# Altium footprint library Toi Library.PcbLib: 740 footprints (part 32 of 47)
Each footprint in its own frame and in the unit in brackets; x right, y up, seen from the top. Pads: shape width x height; smd on the part's side, far side on the other; paste and mask are expansions set on the pad; w line width, h text height; cw(c..) or ccw(c..) is an arc to the next point about the centre after c.
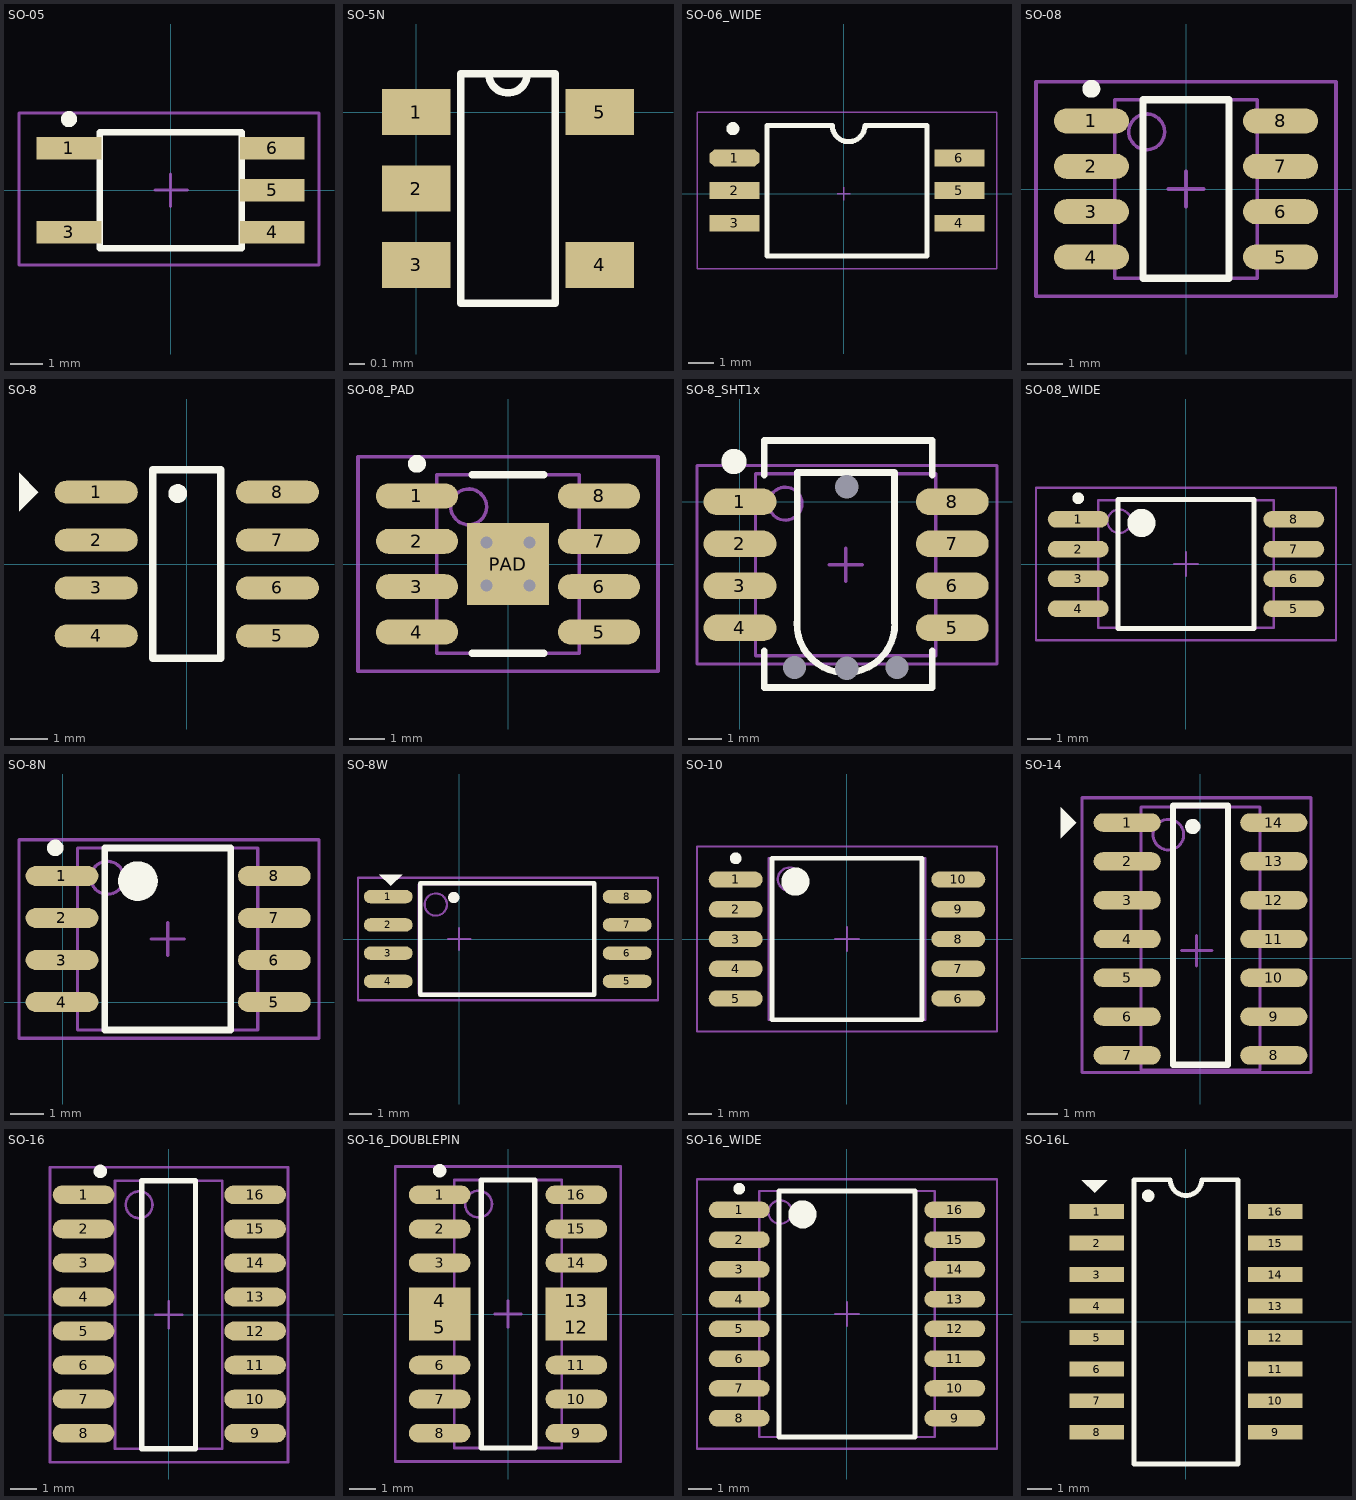
[diagram p31: the footprints below, top view; thin cyan lines are the x and y axes]

## SO-05 [mm] "SOIC, 8-Leads, Body 4.9x3.9mm, Pitch 1.27mm, IPC Low Density"
height 2.59
pads (5):
  rect 2x0.7 smd: 1(-3.15,1.3) 3(-3.15,-1.3) 4(3.15,-1.3) 5(3.15,0) 6(3.15,1.3)
Top Overlay:
  circle w0.25: c-3.15,2.2 r0.125
  lines w0.2: -2.2,-1.8 -2.2,1.8 2.2,1.8 2.2,-1.8 -2.2,-1.8
Mechanical 13:
  lines w0.1: -2.2,-1.8 -2.2,1.8 2.2,1.8 2.2,-1.8 -2.2,-1.8
Mechanical 15:
  lines w0.1: -0.475,0 0.525,0 ; 0,-0.5 0,0.5 ; -4.7,-2.325 -4.7,2.395 4.6,2.395 4.6,-2.325 -4.7,-2.325
3D body: height 2.59, standoff 0, extent -2.2,-1.8 2.2,1.8

## SO-5N [mm]
pads (5):
  rect 0.45x0.3 smd mask+0.05: 1(0,0) 2(0,-0.5) 3(0,-1) 4(1.2,-1) 5(1.2,0)
Top Overlay:
  lines w0.05: 0.29,-1.25 0.91,-1.25 0.91,0.25 0.475,0.25 ccw(c0.6,0.25) 0.725,0.25 0.29,0.25 0.29,-1.25

## SO-06_WIDE [mil]
height 125.2
pads (6):
  oct 76x26 smd: 1(-167.5,55)
  rect 76x26 smd: 2(-167.5,5) 3(-167.5,-45) 4(177.5,-45) 5(177.5,5) 6(177.5,55)
Top Overlay:
  circle w10: c-170,100 r5
  lines w7.87: -117.5,-95 -117.5,105 -17.5,105 ccw(c7.5,105) 32.5,105 127.5,105 127.5,-95 -117.5,-95
Mechanical 15:
  lines w1.97: -10,0 10,0 ; 0,-10 0,10 ; -225,-115 -225,125 235,125 235,-115 -225,-115
3D body: height 125.2, standoff 0, extent -117.52,-95.02 127.52,105.02

## SO-08 [mm] "SOIC, 8-Leads, Body 4.9x3.9mm, Pitch 1.27mm, IPC Low Density"
height 2.59
pads (8):
  oval 2.1x0.7 smd: 1(-2.65,1.905) 2(-2.65,0.635) 3(-2.65,-0.635) 4(-2.65,-1.905) 5(2.65,-1.905) 6(2.65,-0.635) 7(2.65,0.635) 8(2.65,1.905)
Top Overlay:
  circle w0.25: c-2.65,2.805 r0.125
  lines w0.2: -1.2,-2.5 -1.2,2.5 1.2,2.5 1.2,-2.5 -1.2,-2.5
Mechanical 13:
  circle w0.1: c-1.1,1.6 r0.5
  lines w0.1: -2,-2.5 -2,2.5 2,2.5 2,-2.5 -2,-2.5
Mechanical 15:
  lines w0.1: -0.5,0 0.5,0 ; 0,-0.5 0,0.5 ; -4.2,-3 -4.2,3 4.2,3 4.2,-3 -4.2,-3
3D body: height 2.59, standoff 0, extent -2,-2.5 2,2.5

## SO-8 [mm] "8-Pin Small Outline Integrated Circuit 1.27 mm Pitch, IPC Medium Density"
height 1.75
pads (8):
  oval 2.2x0.6 smd: 1(-2.4,1.905) 2(-2.4,0.635) 3(-2.4,-0.635) 4(-2.4,-1.905) 5(2.4,-1.905) 6(2.4,-0.635) 7(2.4,0.635) 8(2.4,1.905)
Top Overlay:
  circle w0.25: c-0.241,1.866 r0.125
  region: -4.445,1.397 -3.937,1.905 -4.445,2.413
  lines w0.2: -0.9,-2.5 -0.9,2.5 0.9,2.5 0.9,-2.5 -0.9,-2.5
3D body "User Library-SOIC-8.STEP": height 1.75, standoff 0, extent -2.93,-2.511 3.082,2.489

## SO-08_PAD [mm] "SOIC, 8-Leads, Body 4.9x3.9mm, Pitch 1.27mm, Exposed Pad, IPC Low Density"
height 1.68
pads (9):
  oval 2.3x0.7 smd: 1(-2.55,1.905) 2(-2.55,0.635) 3(-2.55,-0.635) 4(-2.55,-1.905) 5(2.55,-1.905) 6(2.55,-0.635) 7(2.55,0.635) 8(2.55,1.905)
  rect 2.29x2.29 smd: PAD(0,0)
via -0.6,0.6 diameter 0.66 hole 0.33
via 0.6,0.6 diameter 0.66 hole 0.33
via 0.6,-0.6 diameter 0.66 hole 0.33
via -0.6,-0.6 diameter 0.66 hole 0.33
Top Overlay:
  circle w0.25: c-2.55,2.805 r0.125
  lines w0.2: -1,-2.5 1,-2.5 ; -1,2.5 1,2.5 -1,2.5
Mechanical 13:
  circle w0.1: c-1.1,1.6 r0.5
  lines w0.1: -2,-2.5 2,-2.5 2,2.5 -2,2.5 -2,-2.5
Mechanical 15:
  lines w0.1: -4.2,-3 4.2,-3 4.2,3 -4.2,3 -4.2,-3 ; -0.5,0 0.5,0 -0.5,0 ; 0,-0.5 0,0.5 0,-0.5
3D body: height 1.68, standoff 0.03, extent -2,-2.5 2,2.5

## SO-8_SHT1x [mm] "SOP, 8-Leads, Body 5.3x5.3mm, Pitch 1.27mm, IPC Medium Density"
height 2.03
pads (12):
  round 0 hole 0.7: 0(1.651,-5.004) 0(3.226,-5.029) 0(3.226,0.457) 0(4.75,-5.004)
  oval 2.2x0.8 smd: 1(0,0) 2(0,-1.27) 3(0,-2.54) 4(0,-3.81) 5(6.419,-3.81) 6(6.419,-2.54) 7(6.419,-1.27) 8(6.419,0)
Top Overlay:
  circle w0.6: c-0.183,1.219 r0.081
  lines w0.2: 0.737,-4.5 0.737,-5.613 5.817,-5.613 5.817,-4.5 ; 0.737,0.8 0.737,1.854 5.817,1.854 5.817,0.8
  lines w0.203: 1.72,-3.645 ccw(c3.2,-3.683) 4.681,-3.659 ; 1.727,-3.708 1.727,0.889 4.674,0.889 4.674,-3.658
Mechanical 13:
  circle w0.1: c1.372,-0.055 r0.5
  lines w0.1: 0.472,-4.655 5.922,-4.655 5.922,0.845 0.472,0.845 0.472,-4.655
Mechanical 15:
  lines w0.1: 2.697,-1.905 3.697,-1.905 ; 3.197,-2.405 3.197,-1.405 ; -1.299,-4.905 7.769,-4.905 7.769,1.095 -1.299,1.095 -1.299,-4.905
3D body "User Library-SOIC.STEP": height 1.7, standoff 0, extent 0.098,-4.293 6.296,0.533

## SO-08_WIDE [mm] "SOIC, 8-Leads, Body 5.3x7.5mm, Pitch 1.27mm, IPC Low Density"
height 2.65
pads (8):
  oval 2.6x0.7 smd: 1(-4.6,1.905) 2(-4.6,0.635) 3(-4.6,-0.635) 4(-4.6,-1.905) 5(4.6,-1.905) 6(4.6,-0.635) 7(4.6,0.635) 8(4.6,1.905)
Top Overlay:
  circle w0.25: c-4.6,2.805 r0.125
  circle w0.6: c-1.9,1.75 r0.3
  lines w0.2: -2.9,-2.75 -2.9,2.75 2.9,2.75 2.9,-2.75 -2.9,-2.75
Mechanical 13:
  circle w0.1: c-2.85,1.825 r0.5
  lines w0.1: -3.75,-2.725 -3.75,2.725 3.75,2.725 3.75,-2.725 -3.75,-2.725
Mechanical 15:
  lines w0.1: -0.5,0 0.5,0 ; 0,-0.5 0,0.5 ; -6.4,-3.25 -6.4,3.25 6.4,3.25 6.4,-3.25 -6.4,-3.25
3D body: height 2.65, standoff 0, extent -3.75,-2.725 3.75,2.725

## SO-8N [mm] "SOP, 8-Leads, Body 5.3x5.3mm, Pitch 1.27mm, IPC Medium Density"
height 2.03
pads (8):
  oval 2.2x0.6 smd: 1(-0.022,3.81) 2(-0.022,2.54) 3(-0.022,1.27) 4(-0.022,0) 5(6.397,0) 6(6.397,1.27) 7(6.397,2.54) 8(6.397,3.81)
Top Overlay:
  circle w0.25: c-0.225,4.66 r0.125
  circle w0.6: c2.275,3.655 r0.3
  lines w0.2: 1.275,-0.845 1.275,4.655 5.075,4.655 5.075,-0.845 1.275,-0.845
Mechanical 13:
  circle w0.1: c1.35,3.755 r0.5
  lines w0.1: 0.45,-0.845 0.45,4.655 5.9,4.655 5.9,-0.845 0.45,-0.845
Mechanical 15:
  lines w0.1: 2.675,1.905 3.675,1.905 ; 3.175,1.405 3.175,2.405 ; -1.321,-1.095 -1.321,4.905 7.747,4.905 7.747,-1.095 -1.321,-1.095
3D body "User Library-SOIC.STEP": height 1.7, standoff 0, extent 0.076,-0.483 6.274,4.343

## SO-8W [mm] "8-Pin Small Outline Integrated Circuit 1.27 mm Pitch, IPC Medium Density"
height 1.75
pads (8):
  oval 2.2x0.6 smd: 1(-3.187,1.905) 2(-3.187,0.635) 3(-3.187,-0.635) 4(-3.187,-1.905) 5(7.556,-1.905) 6(7.556,-0.635) 7(7.556,0.635) 8(7.556,1.905)
Top Overlay:
  circle w0.25: c-0.241,1.866 r0.125
  region: -3.581,2.896 -3.073,2.388 -2.565,2.896
  lines w0.2: -1.753,-2.5 6.071,-2.5 6.071,2.5 -1.753,2.5 -1.753,-2.5
Mechanical 13:
  circle w0.1: c-1.05,1.55 r0.5
  lines w0.1: -1.829,-2.45 6.096,-2.45 6.096,2.45 -1.829,2.45 -1.829,-2.45
Mechanical 15:
  lines w0.1: -0.5,0 0.5,0 ; 0,-0.5 0,0.5 ; -4.547,-2.75 8.941,-2.75 8.941,2.75 -4.547,2.75 -4.547,-2.75
3D body "User Library-SOIC (2).STEP": height 1.7, standoff 0, extent -3.124,-2.413 7.518,2.413

## SO-10 [mm] "CERPACK, 10-Leads, Body 6.9x6.3mm, Pitch 1.27mm, IPC Low Density"
height 2.25
pads (10):
  oval 2.3x0.7 smd: 1(-4.75,2.54) 2(-4.75,1.27) 3(-4.75,0) 4(-4.75,-1.27) 5(-4.75,-2.54) 6(4.75,-2.54) 7(4.75,-1.27) 8(4.75,0) 9(4.75,1.27) 10(4.75,2.54)
Top Overlay:
  circle w0.6: c-2.2,2.45 r0.3
  circle w0.25: c-4.75,3.44 r0.125
  lines w0.2: -3.2,-3.45 3.2,-3.45 3.2,3.45 -3.2,3.45 -3.2,-3.45
Mechanical 13:
  circle w0.1: c-2.45,2.55 r0.5
  lines w0.1: -3.35,-3.45 3.35,-3.45 3.35,3.45 -3.35,3.45 -3.35,-3.45
Mechanical 15:
  lines w0.1: -0.5,0 0.5,0 ; 0,-0.5 0,0.5 ; -6.4,-3.95 6.4,-3.95 6.4,3.95 -6.4,3.95 -6.4,-3.95
3D body: height 2.25, standoff 0.1, extent -3.4,-3.5 3.4,3.5

## SO-14 [mm] "SOIC, 14-Leads, Body 9.9x3.9mm, Pitch 1.27mm, IPC Medium Density"
height 1.75
pads (14):
  oval 2.2x0.6 smd: 1(-2.4,4.445) 2(-2.4,3.175) 3(-2.4,1.905) 4(-2.4,0.635) 5(-2.4,-0.635) 6(-2.4,-1.905) 7(-2.4,-3.175) 8(2.4,-3.175) 9(2.4,-1.905) 10(2.4,-0.635) 11(2.4,0.635) 12(2.4,1.905) 13(2.4,3.175) 14(2.4,4.445)
Top Overlay:
  circle w0.25: c-0.252,4.318 r0.125
  region: -4.572,3.937 -4.064,4.445 -4.572,4.953
  lines w0.2: -0.9,-3.48 -0.9,5 0.9,5 0.9,-3.48 -0.9,-3.48
Mechanical 13:
  circle w0.1: c-1.05,4.05 r0.5
  lines w0.1: -1.95,-3.658 -1.95,4.95 1.95,4.95 1.95,-3.658 -1.95,-3.658
Mechanical 15:
  lines w0.1: -0.627,0.254 0.373,0.254 ; -0.127,-0.246 -0.127,0.754 ; -3.877,-3.734 -3.877,5.258 3.623,5.258 3.623,-3.734 -3.877,-3.734
3D body "User Library-SOIC.STEP14N": height 1.7, standoff 0, extent -2.997,-3.708 3.2,4.928

## SO-16 [mm] "SOIC, 16-Leads, Body 9.9x3.9mm, Pitch 1.27mm, IPC Low Density"
height 1.73
pads (16):
  oval 2.3x0.7 smd: 1(-3.175,4.47) 2(-3.175,3.2) 3(-3.175,1.93) 4(-3.175,0.66) 5(-3.175,-0.61) 6(-3.175,-1.88) 7(-3.175,-3.15) 8(-3.175,-4.42) 9(3.225,-4.42) 10(3.225,-3.15) 11(3.225,-1.88) 12(3.225,-0.61) 13(3.225,0.66) 14(3.225,1.93) 15(3.225,3.2) 16(3.225,4.47)
Top Overlay:
  circle w0.25: c-2.55,5.345 r0.125
  lines w0.2: -1,-5 1,-5 1,5 -1,5 -1,-5
Mechanical 13:
  circle w0.1: c-1.1,4.1 r0.5
  lines w0.1: -2,-5 2,-5 2,5 -2,5 -2,-5
Mechanical 15:
  lines w0.1: -0.5,0 0.5,0 ; 0,-0.5 0,0.5 ; -4.425,-5.5 4.45,-5.5 4.45,5.5 -4.425,5.5 -4.425,-5.5
3D body "SOP16_208mil (5_3mm).STEP": height 1.8, standoff -0.2, extent -3.96,-5.075 3.961,5.125

## SO-16_DOUBLEPIN [mm] "16-Pin Small Outline Integrated Circuit 1.27 mm Pitch"
height 1.5
pads (16):
  oval 2.3x0.7 smd: 1(-2.55,4.445) 2(-2.55,3.175) 3(-2.55,1.905) 6(-2.55,-1.905) 7(-2.55,-3.175) 8(-2.55,-4.445) 9(2.55,-4.445) 10(2.55,-3.175) 11(2.55,-1.905) 14(2.55,1.905) 15(2.55,3.175) 16(2.55,4.445)
  rect 2.3x0.99 smd: 4(-2.55,0.49) 5(-2.55,-0.49) 12(2.55,-0.49) 13(2.55,0.49)
Top Overlay:
  circle w0.25: c-2.55,5.345 r0.125
  lines w0.2: -1,-5 -1,5 1,5 1,-5 -1,-5
Mechanical 13:
  circle w0.1: c-1.1,4.1 r0.5
  lines w0.1: -2,-5 -2,5 2,5 2,-5 -2,-5
Mechanical 15:
  lines w0.1: -0.5,0 0.5,0 ; 0,-0.5 0,0.5 ; -4.2,-5.5 -4.2,5.5 4.2,5.5 4.2,-5.5 -4.2,-5.5
3D body: height 1.5, standoff 0, extent -2,-5 2,5

## SO-16_WIDE [mm] "SOIC, 16-Leads, Body 10.3x7.5mm, Pitch 1.27mm, IPC Low Density"
height 2.65
pads (16):
  oval 2.6x0.7 smd: 1(-4.6,4.445) 2(-4.6,3.175) 3(-4.6,1.905) 4(-4.6,0.635) 5(-4.6,-0.635) 6(-4.6,-1.905) 7(-4.6,-3.175) 8(-4.6,-4.445) 9(4.6,-4.445) 10(4.6,-3.175) 11(4.6,-1.905) 12(4.6,-0.635) 13(4.6,0.635) 14(4.6,1.905) 15(4.6,3.175) 16(4.6,4.445)
Top Overlay:
  circle w0.6: c-1.9,4.25 r0.3
  circle w0.25: c-4.6,5.345 r0.125
  lines w0.2: -2.9,-5.25 2.9,-5.25 2.9,5.25 -2.9,5.25 -2.9,-5.25
Mechanical 13:
  circle w0.1: c-2.85,4.35 r0.5
  lines w0.1: -3.75,-5.25 3.75,-5.25 3.75,5.25 -3.75,5.25 -3.75,-5.25
Mechanical 15:
  lines w0.1: -0.5,0 0.5,0 ; 0,-0.5 0,0.5 ; -6.4,-5.75 6.4,-5.75 6.4,5.75 -6.4,5.75 -6.4,-5.75
3D body: height 2.65, standoff 0, extent -3.75,-5.25 3.75,5.25

## SO-16L [mm] "Small Outline; 16 Leads; Body Width 5.6 mm; Pitch 1.27 mm"
height 2
pads (16):
  rect 2.2x0.6 smd: 1(-3.6,4.445) 2(-3.6,3.175) 3(-3.6,1.905) 4(-3.6,0.635) 5(-3.6,-0.635) 6(-3.6,-1.905) 7(-3.6,-3.175) 8(-3.6,-4.445) 9(3.6,-4.445) 10(3.6,-3.175) 11(3.6,-1.905) 12(3.6,-0.635) 13(3.6,0.635) 14(3.6,1.905) 15(3.6,3.175) 16(3.6,4.445)
Top Overlay:
  circle w0.25: c-1.524,5.078 r0.125
  region: -4.191,5.715 -3.683,5.207 -3.175,5.715
  lines w0.2: -2.1,-5.725 -2.1,5.725 -0.635,5.725 ccw(c0,5.725) 0.635,5.725 2.1,5.725 2.1,-5.725 -2.1,-5.725